# Altium schematic symbol library TI Power Management Shunt Voltage Reference.SchLib: 1526 symbols (part 5 of 18)
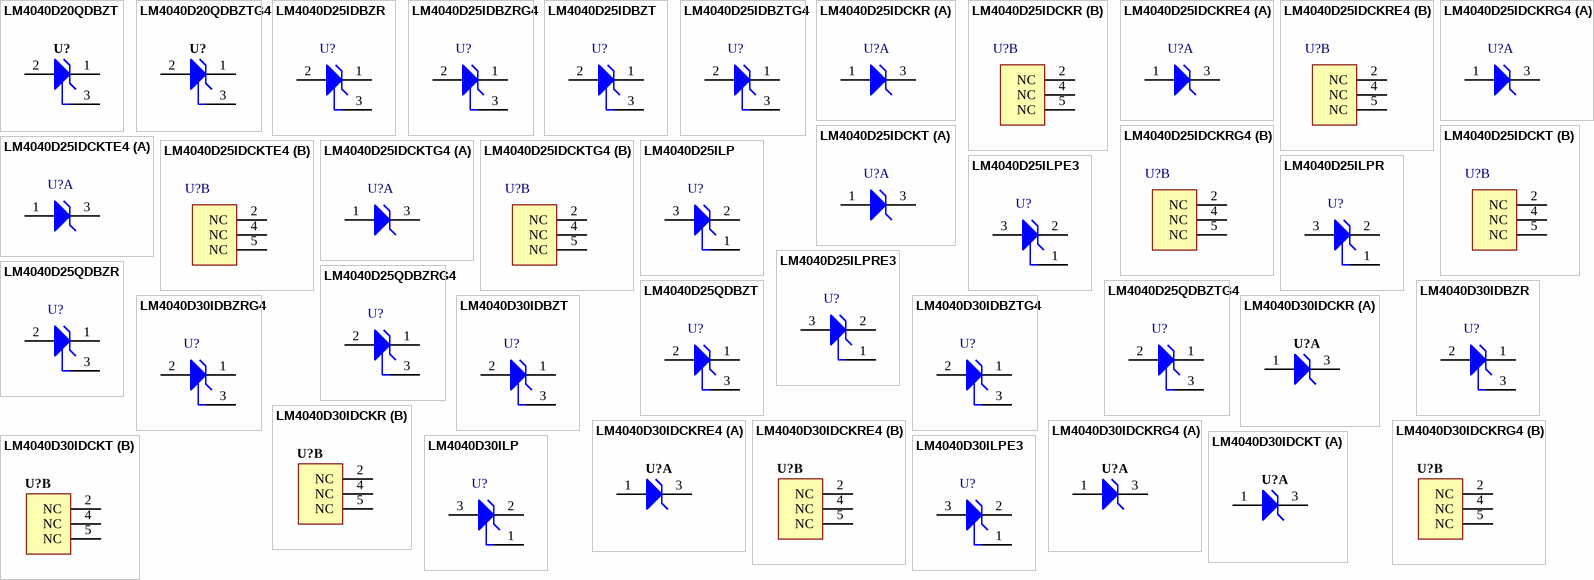
[diagram p61: symbols LM4040D20QDBZT to LM4040D30ILPE3]

## LM4040D25QDBZRG4
designator U?
Precision Micropower Shunt Voltage Reference, 1% accuracy, 2.5 V, 15 ppm / degC, 15 mA, -40 to 125 degC, 3-pin SOT-23 (DBZ), Green (RoHS & no Sb/Br); Manufacturer: Texas Instruments; PartNumber: LM4040D25QDBZRG4; Initial Accuracy @ 25/deg C(%): 1; Iout/Iz(Max)(mA): 15; Min Iz for Regulation(uA): 75; Rating: Catalog; Temp Coeff(Max)(ppm/ degree C): 150; VO(V): 2.5; DatasheetVersion: SLOS456K; PackageVersion: 4203227/B; PackageReference: DBZ3; PackageDescription: 3-Pin Plastic Small Outline, Body 2.92 x 1.3 mm, Pitch 0.95 mm; Supplier 1: Digi-Key; Supplier Part Number 1: LM4040D25QDBZRG4-ND; Supplier 2: Mouser; Supplier Part Number 2: 595-LM4040D25QDBZRG4; Eco-Plan: Green (RoHS & no Sb/Br); SubFamily: Shunt Voltage Reference; Temp Coeff(Typ)(ppm/ degree C): 15; Mounting Technology: Surface Mount; Code_JEDEC: TO-236; ComponentLink1Description: Manufacturer URL; ComponentLink1URL: http://www.ti.com/; ComponentLink2Description: Datasheet; ComponentLink2URL: http://www.ti.com/general/docs/lit/getliterature.tsp?genericPartNumber=LM4040D25&fileType=pdf; ComponentLink3Description: Package Specification; ComponentLink3URL: http://www.ti.com/litv/pdf/mpds108a
footprint TI-DBZ3_N (SOT23, 3-Leads, Body 2.92x1.3 mm, Pitch 0.95 mm, IPC Medium Density)
pins: 1 CATHODE, 2 ANODE, 3 NC

## LM4040D25QDBZT
designator U?
Precision Micropower Shunt Voltage Reference, 1% accuracy, 2.5 V, 15 ppm / degC, 15 mA, -40 to 125 degC, 3-pin SOT-23 (DBZ), Green (RoHS & no Sb/Br); Manufacturer: Texas Instruments; PartNumber: LM4040D25QDBZT; Initial Accuracy @ 25/deg C(%): 1; Iout/Iz(Max)(mA): 15; Min Iz for Regulation(uA): 75; Rating: Catalog; Temp Coeff(Max)(ppm/ degree C): 150; VO(V): 2.5; DatasheetVersion: SLOS456K; PackageVersion: 4203227/B; PackageReference: DBZ3; PackageDescription: 3-Pin Plastic Small Outline, Body 2.92 x 1.3 mm, Pitch 0.95 mm; Supplier 1: Digi-Key; Supplier Part Number 1: 296-32120-2-ND; Supplier 2: Digi-Key; Supplier Part Number 2: 296-32120-1-ND; Supplier 3: Digi-Key; Supplier Part Number 3: 296-32120-6-ND; Supplier 4: Newark; Supplier Part Number 4: 31K7134; Supplier 5: Mouser; Supplier Part Number 5: 595-LM4040D25QDBZT; Eco-Plan: Green (RoHS & no Sb/Br); SubFamily: Shunt Voltage Reference; Temp Coeff(Typ)(ppm/ degree C): 15; Mounting Technology: Surface Mount; Code_JEDEC: TO-236; ComponentLink1Description: Manufacturer URL; ComponentLink1URL: http://www.ti.com/; ComponentLink2Description: Datasheet; ComponentLink2URL: http://www.ti.com/general/docs/lit/getliterature.tsp?genericPartNumber=LM4040D25&fileType=pdf; ComponentLink3Description: Package Specification; ComponentLink3URL: http://www.ti.com/litv/pdf/mpds108a
footprint TI-DBZ3_N (SOT23, 3-Leads, Body 2.92x1.3 mm, Pitch 0.95 mm, IPC Medium Density)
pins: 1 CATHODE, 2 ANODE, 3 NC

## LM4040D25QDBZTG4
designator U?
Precision Micropower Shunt Voltage Reference, 1% accuracy, 2.5 V, 15 ppm / degC, 15 mA, -40 to 125 degC, 3-pin SOT-23 (DBZ), Green (RoHS & no Sb/Br); Manufacturer: Texas Instruments; PartNumber: LM4040D25QDBZTG4; Initial Accuracy @ 25/deg C(%): 1; Iout/Iz(Max)(mA): 15; Min Iz for Regulation(uA): 75; Rating: Catalog; Temp Coeff(Max)(ppm/ degree C): 150; VO(V): 2.5; DatasheetVersion: SLOS456K; PackageVersion: 4203227/B; PackageReference: DBZ3; PackageDescription: 3-Pin Plastic Small Outline, Body 2.92 x 1.3 mm, Pitch 0.95 mm; Supplier 1: Digi-Key; Supplier Part Number 1: LM4040D25QDBZTG4-ND; Supplier 2: Farnell; Supplier Part Number 2: 1053806; Supplier 3: Newark; Supplier Part Number 3: 97K3498; Supplier 4: Mouser; Supplier Part Number 4: 595-LM4040D25QDBZTG4; Eco-Plan: Green (RoHS & no Sb/Br); SubFamily: Shunt Voltage Reference; Temp Coeff(Typ)(ppm/ degree C): 15; Mounting Technology: Surface Mount; Code_JEDEC: TO-236; ComponentLink1Description: Manufacturer URL; ComponentLink1URL: http://www.ti.com/; ComponentLink2Description: Datasheet; ComponentLink2URL: http://www.ti.com/general/docs/lit/getliterature.tsp?genericPartNumber=LM4040D25&fileType=pdf; ComponentLink3Description: Package Specification; ComponentLink3URL: http://www.ti.com/litv/pdf/mpds108a; ComponentLink4Description: URL Link1; ComponentLink4URL: Samples URL:http://www.ti.com/product/lm4040d25
footprint TI-DBZ3_N (SOT23, 3-Leads, Body 2.92x1.3 mm, Pitch 0.95 mm, IPC Medium Density)
pins: 1 CATHODE, 2 ANODE, 3 NC

## LM4040D30IDBZR
designator U?
Precision Micropower Shunt Voltage Reference, 1% accuracy, 3 V, 15 ppm / degC, 15 mA, -40 to 85 degC, 3-pin SOT-23 (DBZ), Green (RoHS & no Sb/Br); Manufacturer: Texas Instruments; PartNumber: LM4040D30IDBZR; Initial Accuracy @ 25/deg C(%): 1; Iout/Iz(Max)(mA): 15; Min Iz for Regulation(uA): 65; Rating: Catalog; Temp Coeff(Max)(ppm/ degree C): 150; VO(V): 3; DatasheetVersion: SLOS456K; PackageVersion: 4203227/B; PackageReference: DBZ3; PackageDescription: 3-Pin Plastic Small Outline, Body 2.92 x 1.3 mm, Pitch 0.95 mm; Supplier 1: Digi-Key; Supplier Part Number 1: 296-19437-2-ND; Supplier 2: Digi-Key; Supplier Part Number 2: 296-19437-1-ND; Supplier 3: Digi-Key; Supplier Part Number 3: 296-19437-6-ND; Supplier 4: Newark; Supplier Part Number 4: 66K2459; Supplier 5: Mouser; Supplier Part Number 5: 595-LM4040D30IDBZR; Eco-Plan: Green (RoHS & no Sb/Br); SubFamily: Shunt Voltage Reference; Temp Coeff(Typ)(ppm/ degree C): 15; Mounting Technology: Surface Mount; Code_JEDEC: TO-236; ComponentLink1Description: Manufacturer URL; ComponentLink1URL: http://www.ti.com/; ComponentLink2Description: Datasheet; ComponentLink2URL: http://www.ti.com/general/docs/lit/getliterature.tsp?genericPartNumber=LM4040D30&fileType=pdf; ComponentLink3Description: Package Specification; ComponentLink3URL: http://www.ti.com/litv/pdf/mpds108a
footprint TI-DBZ3_N (SOT23, 3-Leads, Body 2.92x1.3 mm, Pitch 0.95 mm, IPC Medium Density)
pins: 1 CATHODE, 2 ANODE, 3 NC

## LM4040D30IDBZRG4
designator U?
Precision Micropower Shunt Voltage Reference, 1% accuracy, 3 V, 15 ppm / degC, 15 mA, -40 to 85 degC, 3-pin SOT-23 (DBZ), Green (RoHS & no Sb/Br); Manufacturer: Texas Instruments; PartNumber: LM4040D30IDBZRG4; Initial Accuracy @ 25/deg C(%): 1; Iout/Iz(Max)(mA): 15; Min Iz for Regulation(uA): 65; Rating: Catalog; Temp Coeff(Max)(ppm/ degree C): 150; VO(V): 3; DatasheetVersion: SLOS456K; PackageVersion: 4203227/B; PackageReference: DBZ3; PackageDescription: 3-Pin Plastic Small Outline, Body 2.92 x 1.3 mm, Pitch 0.95 mm; Supplier 1: Digi-Key; Supplier Part Number 1: LM4040D30IDBZRG4-ND; Supplier 2: Newark; Supplier Part Number 2: 85K1033; Supplier 3: Mouser; Supplier Part Number 3: 595-LM4040D30IDBZRG4; Eco-Plan: Green (RoHS & no Sb/Br); SubFamily: Shunt Voltage Reference; Temp Coeff(Typ)(ppm/ degree C): 15; Mounting Technology: Surface Mount; Code_JEDEC: TO-236; ComponentLink1Description: Manufacturer URL; ComponentLink1URL: http://www.ti.com/; ComponentLink2Description: Datasheet; ComponentLink2URL: http://www.ti.com/general/docs/lit/getliterature.tsp?genericPartNumber=LM4040D30&fileType=pdf; ComponentLink3Description: Package Specification; ComponentLink3URL: http://www.ti.com/litv/pdf/mpds108a
footprint TI-DBZ3_N (SOT23, 3-Leads, Body 2.92x1.3 mm, Pitch 0.95 mm, IPC Medium Density)
pins: 1 CATHODE, 2 ANODE, 3 NC

## LM4040D30IDBZT
designator U?
Precision Micropower Shunt Voltage Reference, 1% accuracy, 3 V, 15 ppm / degC, 15 mA, -40 to 85 degC, 3-pin SOT-23 (DBZ), Green (RoHS & no Sb/Br); Manufacturer: Texas Instruments; PartNumber: LM4040D30IDBZT; Initial Accuracy @ 25/deg C(%): 1; Iout/Iz(Max)(mA): 15; Min Iz for Regulation(uA): 65; Rating: Catalog; Temp Coeff(Max)(ppm/ degree C): 150; VO(V): 3; DatasheetVersion: SLOS456K; PackageVersion: 4203227/B; PackageReference: DBZ3; PackageDescription: 3-Pin Plastic Small Outline, Body 2.92 x 1.3 mm, Pitch 0.95 mm; Supplier 1: Digi-Key; Supplier Part Number 1: 296-32121-2-ND; Supplier 2: Digi-Key; Supplier Part Number 2: 296-32121-1-ND; Supplier 3: Digi-Key; Supplier Part Number 3: 296-32121-6-ND; Supplier 4: Newark; Supplier Part Number 4: 66K2460; Supplier 5: Mouser; Supplier Part Number 5: 595-LM4040D30IDBZT; Eco-Plan: Green (RoHS & no Sb/Br); SubFamily: Shunt Voltage Reference; Temp Coeff(Typ)(ppm/ degree C): 15; Mounting Technology: Surface Mount; Code_JEDEC: TO-236; ComponentLink1Description: Manufacturer URL; ComponentLink1URL: http://www.ti.com/; ComponentLink2Description: Datasheet; ComponentLink2URL: http://www.ti.com/general/docs/lit/getliterature.tsp?genericPartNumber=LM4040D30&fileType=pdf; ComponentLink3Description: Package Specification; ComponentLink3URL: http://www.ti.com/litv/pdf/mpds108a
footprint TI-DBZ3_N (SOT23, 3-Leads, Body 2.92x1.3 mm, Pitch 0.95 mm, IPC Medium Density)
pins: 1 CATHODE, 2 ANODE, 3 NC

## LM4040D30IDBZTG4
designator U?
Precision Micropower Shunt Voltage Reference, 1% accuracy, 3 V, 15 ppm / degC, 15 mA, -40 to 85 degC, 3-pin SOT-23 (DBZ), Green (RoHS & no Sb/Br); Manufacturer: Texas Instruments; PartNumber: LM4040D30IDBZTG4; Initial Accuracy @ 25/deg C(%): 1; Iout/Iz(Max)(mA): 15; Min Iz for Regulation(uA): 65; Rating: Catalog; Temp Coeff(Max)(ppm/ degree C): 150; VO(V): 3; DatasheetVersion: SLOS456K; PackageVersion: 4203227/B; PackageReference: DBZ3; PackageDescription: 3-Pin Plastic Small Outline, Body 2.92 x 1.3 mm, Pitch 0.95 mm; Supplier 1: Digi-Key; Supplier Part Number 1: LM4040D30IDBZTG4-ND; Supplier 2: Farnell; Supplier Part Number 2: 1494903; Supplier 3: Newark; Supplier Part Number 3: 61M7487; Supplier 4: Mouser; Supplier Part Number 4: 595-LM4040D30IDBZTG4; Eco-Plan: Green (RoHS & no Sb/Br); SubFamily: Shunt Voltage Reference; Temp Coeff(Typ)(ppm/ degree C): 15; Mounting Technology: Surface Mount; Code_JEDEC: TO-236; ComponentLink1Description: Manufacturer URL; ComponentLink1URL: http://www.ti.com/; ComponentLink2Description: Datasheet; ComponentLink2URL: http://www.ti.com/general/docs/lit/getliterature.tsp?genericPartNumber=LM4040D30&fileType=pdf; ComponentLink3Description: Package Specification; ComponentLink3URL: http://www.ti.com/litv/pdf/mpds108a
footprint TI-DBZ3_N (SOT23, 3-Leads, Body 2.92x1.3 mm, Pitch 0.95 mm, IPC Medium Density)
pins: 1 CATHODE, 2 ANODE, 3 NC

## LM4040D30IDCKR
designator U?
Precision Micropower Shunt Voltage Reference, 1% accuracy, 3 V, 15 ppm / degC, 15 mA, -40 to 85 degC, 5-pin SC70 (DCK), Green (RoHS & no Sb/Br); Manufacturer: Texas Instruments; PartNumber: LM4040D30IDCKR; Initial Accuracy @ 25/deg C(%): 1; Iout/Iz(Max)(mA): 15; Min Iz for Regulation(uA): 65; Rating: Catalog; Temp Coeff(Max)(ppm/ degree C): 150; VO(V): 3; DatasheetVersion: SLOS456K; PackageReference: DCK5; PackageDescription: 5-Pin Plastic Small-Outline Package, 2 x 1.3 mm Body, 0.65 mm Pitch, 2.1 mm Lead Span; Supplier 1: Digi-Key; Supplier Part Number 1: 296-20902-2-ND; Supplier 2: Digi-Key; Supplier Part Number 2: 296-20902-1-ND; Supplier 3: Digi-Key; Supplier Part Number 3: 296-20902-6-ND; Supplier 4: Farnell; Supplier Part Number 4: 2144324; Supplier 5: Newark; Supplier Part Number 5: 66K2461; Supplier 6: Newark; Supplier Part Number 6: 46W1549; Supplier 7: Mouser; Supplier Part Number 7: 595-LM4040D30IDCKR; Eco-Plan: Green (RoHS & no Sb/Br); SubFamily: Shunt Voltage Reference; Temp Coeff(Typ)(ppm/ degree C): 15; Mounting Technology: Surface Mount; Code_JEDEC: MO-203; ComponentLink1Description: Manufacturer URL; ComponentLink1URL: http://www.ti.com/; ComponentLink2Description: Datasheet; ComponentLink2URL: http://www.ti.com/general/docs/lit/getliterature.tsp?genericPartNumber=LM4040D30&fileType=pdf; ComponentLink3Description: Package Specification; ComponentLink3URL: http://www.ti.com/litv/pdf/mpds025f
footprint TI-DCK5_N (SOT353, 5-Leads, Body 2x1.3mm, Pitch 0.65mm, Lead Span 2.1mm, IPC Medium Density)
part A pins: 1 ANODE, 3 CATHODE
part B pins: 2 NC, 4 NC, 5 NC

## LM4040D30IDCKRE4
designator U?
Precision Micropower Shunt Voltage Reference, 1% accuracy, 3 V, 15 ppm / degC, 15 mA, -40 to 85 degC, 5-pin SC70 (DCK), Green (RoHS & no Sb/Br); Manufacturer: Texas Instruments; PartNumber: LM4040D30IDCKRE4; Initial Accuracy @ 25/deg C(%): 1; Iout/Iz(Max)(mA): 15; Min Iz for Regulation(uA): 65; Rating: Catalog; Temp Coeff(Max)(ppm/ degree C): 150; VO(V): 3; DatasheetVersion: SLOS456K; PackageReference: DCK5; PackageDescription: 5-Pin Plastic Small-Outline Package, 2 x 1.3 mm Body, 0.65 mm Pitch, 2.1 mm Lead Span; Supplier 1: Digi-Key; Supplier Part Number 1: LM4040D30IDCKRE4-ND; Supplier 2: Mouser; Supplier Part Number 2: 595-LM4040D30IDCKRE4; Eco-Plan: Green (RoHS & no Sb/Br); SubFamily: Shunt Voltage Reference; Temp Coeff(Typ)(ppm/ degree C): 15; Mounting Technology: Surface Mount; Code_JEDEC: MO-203; ComponentLink1Description: Manufacturer URL; ComponentLink1URL: http://www.ti.com/; ComponentLink2Description: Datasheet; ComponentLink2URL: http://www.ti.com/general/docs/lit/getliterature.tsp?genericPartNumber=LM4040D30&fileType=pdf; ComponentLink3Description: Package Specification; ComponentLink3URL: http://www.ti.com/litv/pdf/mpds025f
footprint TI-DCK5_N (SOT353, 5-Leads, Body 2x1.3mm, Pitch 0.65mm, Lead Span 2.1mm, IPC Medium Density)
part A pins: 1 ANODE, 3 CATHODE
part B pins: 2 NC, 4 NC, 5 NC

## LM4040D30IDCKRG4
designator U?
Precision Micropower Shunt Voltage Reference, 1% accuracy, 3 V, 15 ppm / degC, 15 mA, -40 to 85 degC, 5-pin SC70 (DCK), Green (RoHS & no Sb/Br); Manufacturer: Texas Instruments; PartNumber: LM4040D30IDCKRG4; Initial Accuracy @ 25/deg C(%): 1; Iout/Iz(Max)(mA): 15; Min Iz for Regulation(uA): 65; Rating: Catalog; Temp Coeff(Max)(ppm/ degree C): 150; VO(V): 3; DatasheetVersion: SLOS456K; PackageReference: DCK5; PackageDescription: 5-Pin Plastic Small-Outline Package, 2 x 1.3 mm Body, 0.65 mm Pitch, 2.1 mm Lead Span; Supplier 1: Digi-Key; Supplier Part Number 1: LM4040D30IDCKRG4-ND; Supplier 2: Newark; Supplier Part Number 2: 41M3451; Supplier 3: Mouser; Supplier Part Number 3: 595-LM4040D30IDCKRG4; Eco-Plan: Green (RoHS & no Sb/Br); SubFamily: Shunt Voltage Reference; Temp Coeff(Typ)(ppm/ degree C): 15; Mounting Technology: Surface Mount; Code_JEDEC: MO-203; ComponentLink1Description: Manufacturer URL; ComponentLink1URL: http://www.ti.com/; ComponentLink2Description: Datasheet; ComponentLink2URL: http://www.ti.com/general/docs/lit/getliterature.tsp?genericPartNumber=LM4040D30&fileType=pdf; ComponentLink3Description: Package Specification; ComponentLink3URL: http://www.ti.com/litv/pdf/mpds025f
footprint TI-DCK5_N (SOT353, 5-Leads, Body 2x1.3mm, Pitch 0.65mm, Lead Span 2.1mm, IPC Medium Density)
part A pins: 1 ANODE, 3 CATHODE
part B pins: 2 NC, 4 NC, 5 NC

## LM4040D30IDCKT
designator U?
Precision Micropower Shunt Voltage Reference, 1% accuracy, 3 V, 15 ppm / degC, 15 mA, -40 to 85 degC, 5-pin SC70 (DCK); Manufacturer: Texas Instruments; PartNumber: LM4040D30IDCKT; Initial Accuracy @ 25/deg C(%): 1; Iout/Iz(Max)(mA): 15; Min Iz for Regulation(uA): 65; Rating: Catalog; Temp Coeff(Max)(ppm/ degree C): 150; VO(V): 3; DatasheetVersion: SLOS456K; PackageReference: DCK5; PackageDescription: 5-Pin Plastic Small-Outline Package, 2 x 1.3 mm Body, 0.65 mm Pitch, 2.1 mm Lead Span; Supplier 1: Mouser; Supplier Part Number 1: N/A; SubFamily: Shunt Voltage Reference; Temp Coeff(Typ)(ppm/ degree C): 15; Mounting Technology: Surface Mount; Code_JEDEC: MO-203; ComponentLink1Description: Manufacturer URL; ComponentLink1URL: http://www.ti.com/; ComponentLink2Description: Datasheet; ComponentLink2URL: http://www.ti.com/general/docs/lit/getliterature.tsp?genericPartNumber=LM4040D30&fileType=pdf; ComponentLink3Description: Package Specification; ComponentLink3URL: http://www.ti.com/litv/pdf/mpds025f
footprint TI-DCK5_N (SOT353, 5-Leads, Body 2x1.3mm, Pitch 0.65mm, Lead Span 2.1mm, IPC Medium Density)
part A pins: 1 ANODE, 3 CATHODE
part B pins: 2 NC, 4 NC, 5 NC

## LM4040D30ILP
designator U?
Precision Micropower Shunt Voltage Reference, 1% accuracy, 3 V, 15 ppm / degC, 15 mA, -40 to 85 degC, 3-pin TO-92 (LP), Pb-Free (RoHS); Manufacturer: Texas Instruments; PartNumber: LM4040D30ILP; Initial Accuracy @ 25/deg C(%): 1; Iout/Iz(Max)(mA): 15; Min Iz for Regulation(uA): 65; Rating: Catalog; Temp Coeff(Max)(ppm/ degree C): 150; VO(V): 3; DatasheetVersion: SLOS456K; PackageVersion: 4040001-2/C; PackageReference: LP3; PackageDescription: Plastic Cylindrical Package, Formed Lead Option (TO-92); Supplier 1: Digi-Key; Supplier Part Number 1: 296-31370-ND; Supplier 2: Newark; Supplier Part Number 2: 33M9287; Supplier 3: Mouser; Supplier Part Number 3: 595-LM4040D30ILP; Eco-Plan: Pb-Free (RoHS); SubFamily: Shunt Voltage Reference; Temp Coeff(Typ)(ppm/ degree C): 15; Mounting Technology: Through Hole; Code_JEDEC: TO-226; ComponentLink1Description: Manufacturer URL; ComponentLink1URL: http://www.ti.com/; ComponentLink2Description: Datasheet; ComponentLink2URL: http://www.ti.com/general/docs/lit/getliterature.tsp?genericPartNumber=LM4040D30&fileType=pdf; ComponentLink3Description: Package Specification; ComponentLink3URL: http://www.ti.com/litv/pdf/msot002a
footprint TI-LP3 (TO, Flat Index; 3 In-Line, Formed Axial Leads; Body Dia. 4.8mm; Leads 0.56 x 0.41 mm (max))
pins: 1 NC "No internal connection", 2 CATHODE, 3 ANODE

## LM4040D30ILPE3
designator U?
Precision Micropower Shunt Voltage Reference, 1% accuracy, 3 V, 15 ppm / degC, 15 mA, -40 to 85 degC, 3-pin TO-92 (LP), Pb-Free (RoHS); Manufacturer: Texas Instruments; PartNumber: LM4040D30ILPE3; Initial Accuracy @ 25/deg C(%): 1; Iout/Iz(Max)(mA): 15; Min Iz for Regulation(uA): 65; Rating: Catalog; Temp Coeff(Max)(ppm/ degree C): 150; VO(V): 3; DatasheetVersion: SLOS456K; PackageVersion: 4040001-2/C; PackageReference: LP3; PackageDescription: Plastic Cylindrical Package, Formed Lead Option (TO-92); Supplier 1: Digi-Key; Supplier Part Number 1: LM4040D30ILPE3-ND; Supplier 2: Newark; Supplier Part Number 2: 65M1438; Supplier 3: Mouser; Supplier Part Number 3: 595-LM4040D30ILPE3; Eco-Plan: Pb-Free (RoHS); SubFamily: Shunt Voltage Reference; Temp Coeff(Typ)(ppm/ degree C): 15; Mounting Technology: Through Hole; Code_JEDEC: TO-226; ComponentLink1Description: Manufacturer URL; ComponentLink1URL: http://www.ti.com/; ComponentLink2Description: Datasheet; ComponentLink2URL: http://www.ti.com/general/docs/lit/getliterature.tsp?genericPartNumber=LM4040D30&fileType=pdf; ComponentLink3Description: Package Specification; ComponentLink3URL: http://www.ti.com/litv/pdf/msot002a
footprint TI-LP3 (TO, Flat Index; 3 In-Line, Formed Axial Leads; Body Dia. 4.8mm; Leads 0.56 x 0.41 mm (max))
pins: 1 NC "No internal connection", 2 CATHODE, 3 ANODE

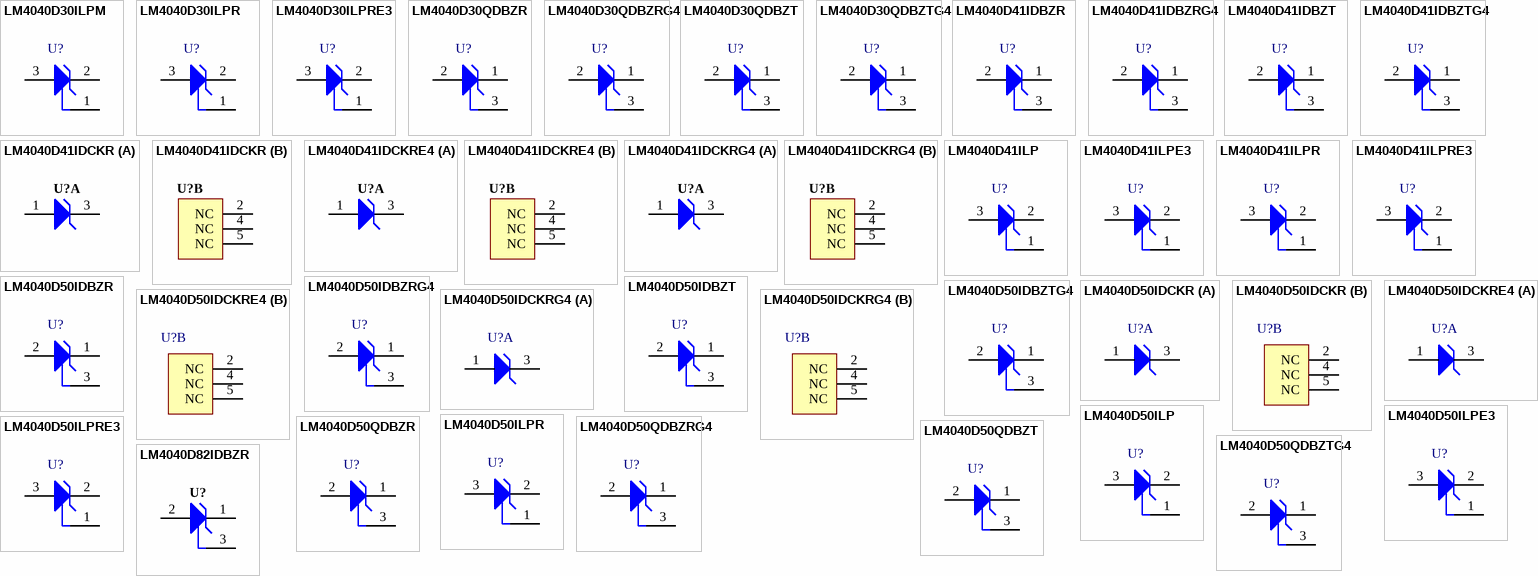
[diagram p13: symbols LM4040D30ILPM to LM4040D82IDBZR]

## LM4040D30ILPM
designator U?
Precision Micropower Shunt Voltage Reference, 1% accuracy, 3 V, 15 ppm / degC, 15 mA, -40 to 85 degC, 3-pin TO-92 (LP); Manufacturer: Texas Instruments; PartNumber: LM4040D30ILPM; Initial Accuracy @ 25/deg C(%): 1; Iout/Iz(Max)(mA): 15; Min Iz for Regulation(uA): 65; Rating: Catalog; Temp Coeff(Max)(ppm/ degree C): 150; VO(V): 3; DatasheetVersion: SLOS456K; PackageVersion: 4040001-2/C; PackageReference: LP3; PackageDescription: Plastic Cylindrical Package, Formed Lead Option (TO-92); Supplier 1: Mouser; Supplier Part Number 1: N/A; SubFamily: Shunt Voltage Reference; Temp Coeff(Typ)(ppm/ degree C): 15; Mounting Technology: Through Hole; Code_JEDEC: TO-226; ComponentLink1Description: Manufacturer URL; ComponentLink1URL: http://www.ti.com/; ComponentLink2Description: Datasheet; ComponentLink2URL: http://www.ti.com/general/docs/lit/getliterature.tsp?genericPartNumber=LM4040D30&fileType=pdf; ComponentLink3Description: Package Specification; ComponentLink3URL: http://www.ti.com/litv/pdf/msot002a
footprint TI-LP3 (TO, Flat Index; 3 In-Line, Formed Axial Leads; Body Dia. 4.8mm; Leads 0.56 x 0.41 mm (max))
pins: 1 NC "No internal connection", 2 CATHODE, 3 ANODE

## LM4040D30ILPR
designator U?
Precision Micropower Shunt Voltage Reference, 1% accuracy, 3 V, 15 ppm / degC, 15 mA, -40 to 85 degC, 3-pin TO-92 (LP), Pb-Free (RoHS); Manufacturer: Texas Instruments; PartNumber: LM4040D30ILPR; Initial Accuracy @ 25/deg C(%): 1; Iout/Iz(Max)(mA): 15; Min Iz for Regulation(uA): 65; Rating: Catalog; Temp Coeff(Max)(ppm/ degree C): 150; VO(V): 3; DatasheetVersion: SLOS456K; PackageVersion: 4040001-2/C; PackageReference: LP3; PackageDescription: Plastic Cylindrical Package, Formed Lead Option (TO-92); Supplier 1: Digi-Key; Supplier Part Number 1: 296-21583-3-ND; Supplier 2: Digi-Key; Supplier Part Number 2: 296-21583-1-ND; Supplier 3: Newark; Supplier Part Number 3: 33M9288; Supplier 4: Mouser; Supplier Part Number 4: 595-LM4040D30ILPR; Eco-Plan: Pb-Free (RoHS); SubFamily: Shunt Voltage Reference; Temp Coeff(Typ)(ppm/ degree C): 15; Mounting Technology: Through Hole; Code_JEDEC: TO-226; ComponentLink1Description: Manufacturer URL; ComponentLink1URL: http://www.ti.com/; ComponentLink2Description: Datasheet; ComponentLink2URL: http://www.ti.com/general/docs/lit/getliterature.tsp?genericPartNumber=LM4040D30&fileType=pdf; ComponentLink3Description: Package Specification; ComponentLink3URL: http://www.ti.com/litv/pdf/msot002a
footprint TI-LP3 (TO, Flat Index; 3 In-Line, Formed Axial Leads; Body Dia. 4.8mm; Leads 0.56 x 0.41 mm (max))
pins: 1 NC "No internal connection", 2 CATHODE, 3 ANODE

## LM4040D30ILPRE3
designator U?
Precision Micropower Shunt Voltage Reference, 1% accuracy, 3 V, 15 ppm / degC, 15 mA, -40 to 85 degC, 3-pin TO-92 (LP), Pb-Free (RoHS); Manufacturer: Texas Instruments; PartNumber: LM4040D30ILPRE3; Initial Accuracy @ 25/deg C(%): 1; Iout/Iz(Max)(mA): 15; Min Iz for Regulation(uA): 65; Rating: Catalog; Temp Coeff(Max)(ppm/ degree C): 150; VO(V): 3; DatasheetVersion: SLOS456K; PackageVersion: 4040001-2/C; PackageReference: LP3; PackageDescription: Plastic Cylindrical Package, Formed Lead Option (TO-92); Supplier 1: Digi-Key; Supplier Part Number 1: LM4040D30ILPRE3-ND; Supplier 2: Mouser; Supplier Part Number 2: 595-LM4040D30ILPRE3; Eco-Plan: Pb-Free (RoHS); SubFamily: Shunt Voltage Reference; Temp Coeff(Typ)(ppm/ degree C): 15; Mounting Technology: Through Hole; Code_JEDEC: TO-226; ComponentLink1Description: Manufacturer URL; ComponentLink1URL: http://www.ti.com/; ComponentLink2Description: Datasheet; ComponentLink2URL: http://www.ti.com/general/docs/lit/getliterature.tsp?genericPartNumber=LM4040D30&fileType=pdf; ComponentLink3Description: Package Specification; ComponentLink3URL: http://www.ti.com/litv/pdf/msot002a
footprint TI-LP3 (TO, Flat Index; 3 In-Line, Formed Axial Leads; Body Dia. 4.8mm; Leads 0.56 x 0.41 mm (max))
pins: 1 NC "No internal connection", 2 CATHODE, 3 ANODE

## LM4040D30QDBZR
designator U?
Precision Micropower Shunt Voltage Reference, 1% accuracy, 3 V, 15 ppm / degC, 15 mA, -40 to 125 degC, 3-pin SOT-23 (DBZ), Green (RoHS & no Sb/Br); Manufacturer: Texas Instruments; PartNumber: LM4040D30QDBZR; Initial Accuracy @ 25/deg C(%): 1; Iout/Iz(Max)(mA): 15; Min Iz for Regulation(uA): 65; Rating: Catalog; Temp Coeff(Max)(ppm/ degree C): 150; VO(V): 3; DatasheetVersion: SLOS456K; PackageVersion: 4203227/B; PackageReference: DBZ3; PackageDescription: 3-Pin Plastic Small Outline, Body 2.92 x 1.3 mm, Pitch 0.95 mm; Supplier 1: Digi-Key; Supplier Part Number 1: 296-20903-2-ND; Supplier 2: Digi-Key; Supplier Part Number 2: 296-20903-1-ND; Supplier 3: Digi-Key; Supplier Part Number 3: 296-20903-6-ND; Supplier 4: Newark; Supplier Part Number 4: 66K2462; Supplier 5: Mouser; Supplier Part Number 5: 595-LM4040D30QDBZR; Eco-Plan: Green (RoHS & no Sb/Br); SubFamily: Shunt Voltage Reference; Temp Coeff(Typ)(ppm/ degree C): 15; Mounting Technology: Surface Mount; Code_JEDEC: TO-236; ComponentLink1Description: Manufacturer URL; ComponentLink1URL: http://www.ti.com/; ComponentLink2Description: Datasheet; ComponentLink2URL: http://www.ti.com/general/docs/lit/getliterature.tsp?genericPartNumber=LM4040D30&fileType=pdf; ComponentLink3Description: Package Specification; ComponentLink3URL: http://www.ti.com/litv/pdf/mpds108a; ComponentLink4Description: URL Link1; ComponentLink4URL: Samples URL:http://www.ti.com/product/lm4040d30
footprint TI-DBZ3_N (SOT23, 3-Leads, Body 2.92x1.3 mm, Pitch 0.95 mm, IPC Medium Density)
pins: 1 CATHODE, 2 ANODE, 3 NC

## LM4040D30QDBZRG4
designator U?
Precision Micropower Shunt Voltage Reference, 1% accuracy, 3 V, 15 ppm / degC, 15 mA, -40 to 125 degC, 3-pin SOT-23 (DBZ), Green (RoHS & no Sb/Br); Manufacturer: Texas Instruments; PartNumber: LM4040D30QDBZRG4; Initial Accuracy @ 25/deg C(%): 1; Iout/Iz(Max)(mA): 15; Min Iz for Regulation(uA): 65; Rating: Catalog; Temp Coeff(Max)(ppm/ degree C): 150; VO(V): 3; DatasheetVersion: SLOS456K; PackageVersion: 4203227/B; PackageReference: DBZ3; PackageDescription: 3-Pin Plastic Small Outline, Body 2.92 x 1.3 mm, Pitch 0.95 mm; Supplier 1: Digi-Key; Supplier Part Number 1: LM4040D30QDBZRG4-ND; Supplier 2: Mouser; Supplier Part Number 2: 595-LM4040D30QDBZRG4; Eco-Plan: Green (RoHS & no Sb/Br); SubFamily: Shunt Voltage Reference; Temp Coeff(Typ)(ppm/ degree C): 15; Mounting Technology: Surface Mount; Code_JEDEC: TO-236; ComponentLink1Description: Manufacturer URL; ComponentLink1URL: http://www.ti.com/; ComponentLink2Description: Datasheet; ComponentLink2URL: http://www.ti.com/general/docs/lit/getliterature.tsp?genericPartNumber=LM4040D30&fileType=pdf; ComponentLink3Description: Package Specification; ComponentLink3URL: http://www.ti.com/litv/pdf/mpds108a; ComponentLink4Description: URL Link1; ComponentLink4URL: Samples URL:http://www.ti.com/product/lm4040d30
footprint TI-DBZ3_N (SOT23, 3-Leads, Body 2.92x1.3 mm, Pitch 0.95 mm, IPC Medium Density)
pins: 1 CATHODE, 2 ANODE, 3 NC

## LM4040D30QDBZT
designator U?
Precision Micropower Shunt Voltage Reference, 1% accuracy, 3 V, 15 ppm / degC, 15 mA, -40 to 125 degC, 3-pin SOT-23 (DBZ), Green (RoHS & no Sb/Br); Manufacturer: Texas Instruments; PartNumber: LM4040D30QDBZT; Initial Accuracy @ 25/deg C(%): 1; Iout/Iz(Max)(mA): 15; Min Iz for Regulation(uA): 65; Rating: Catalog; Temp Coeff(Max)(ppm/ degree C): 150; VO(V): 3; DatasheetVersion: SLOS456K; PackageVersion: 4203227/B; PackageReference: DBZ3; PackageDescription: 3-Pin Plastic Small Outline, Body 2.92 x 1.3 mm, Pitch 0.95 mm; Supplier 1: Digi-Key; Supplier Part Number 1: LM4040D30QDBZT-ND; Supplier 2: Mouser; Supplier Part Number 2: 595-LM4040D30QDBZT; Eco-Plan: Green (RoHS & no Sb/Br); SubFamily: Shunt Voltage Reference; Temp Coeff(Typ)(ppm/ degree C): 15; Mounting Technology: Surface Mount; Code_JEDEC: TO-236; ComponentLink1Description: Manufacturer URL; ComponentLink1URL: http://www.ti.com/; ComponentLink2Description: Datasheet; ComponentLink2URL: http://www.ti.com/general/docs/lit/getliterature.tsp?genericPartNumber=LM4040D30&fileType=pdf; ComponentLink3Description: Package Specification; ComponentLink3URL: http://www.ti.com/litv/pdf/mpds108a
footprint TI-DBZ3_N (SOT23, 3-Leads, Body 2.92x1.3 mm, Pitch 0.95 mm, IPC Medium Density)
pins: 1 CATHODE, 2 ANODE, 3 NC

## LM4040D30QDBZTG4
designator U?
Precision Micropower Shunt Voltage Reference, 1% accuracy, 3 V, 15 ppm / degC, 15 mA, -40 to 125 degC, 3-pin SOT-23 (DBZ), Green (RoHS & no Sb/Br); Manufacturer: Texas Instruments; PartNumber: LM4040D30QDBZTG4; Initial Accuracy @ 25/deg C(%): 1; Iout/Iz(Max)(mA): 15; Min Iz for Regulation(uA): 65; Rating: Catalog; Temp Coeff(Max)(ppm/ degree C): 150; VO(V): 3; DatasheetVersion: SLOS456K; PackageVersion: 4203227/B; PackageReference: DBZ3; PackageDescription: 3-Pin Plastic Small Outline, Body 2.92 x 1.3 mm, Pitch 0.95 mm; Supplier 1: Digi-Key; Supplier Part Number 1: LM4040D30QDBZTG4-ND; Supplier 2: Mouser; Supplier Part Number 2: 595-LM4040D30QDBZTG4; Eco-Plan: Green (RoHS & no Sb/Br); SubFamily: Shunt Voltage Reference; Temp Coeff(Typ)(ppm/ degree C): 15; Mounting Technology: Surface Mount; Code_JEDEC: TO-236; ComponentLink1Description: Manufacturer URL; ComponentLink1URL: http://www.ti.com/; ComponentLink2Description: Datasheet; ComponentLink2URL: http://www.ti.com/general/docs/lit/getliterature.tsp?genericPartNumber=LM4040D30&fileType=pdf; ComponentLink3Description: Package Specification; ComponentLink3URL: http://www.ti.com/litv/pdf/mpds108a; ComponentLink4Description: URL Link1; ComponentLink4URL: Samples URL:http://www.ti.com/product/lm4040d30
footprint TI-DBZ3_N (SOT23, 3-Leads, Body 2.92x1.3 mm, Pitch 0.95 mm, IPC Medium Density)
pins: 1 CATHODE, 2 ANODE, 3 NC

## LM4040D41IDBZR
designator U?
Precision Micropower Shunt Voltage Reference, 1% accuracy, 4.096 V, 15 ppm / degC, 15 mA, -40 to 85 degC, 3-pin SOT-23 (DBZ), Green (RoHS & no Sb/Br); Manufacturer: Texas Instruments; PartNumber: LM4040D41IDBZR; Initial Accuracy @ 25/deg C(%): 1; Iout/Iz(Max)(mA): 15; Min Iz for Regulation(uA): 73; Rating: Catalog; Temp Coeff(Max)(ppm/ degree C): 150; VO(V): 4.096; DatasheetVersion: SLOS456K; PackageVersion: 4203227/B; PackageReference: DBZ3; PackageDescription: 3-Pin Plastic Small Outline, Body 2.92 x 1.3 mm, Pitch 0.95 mm; Supplier 1: Digi-Key; Supplier Part Number 1: 296-20904-2-ND; Supplier 2: Digi-Key; Supplier Part Number 2: 296-20904-1-ND; Supplier 3: Digi-Key; Supplier Part Number 3: 296-20904-6-ND; Supplier 4: Farnell; Supplier Part Number 4: 1575269; Supplier 5: Newark; Supplier Part Number 5: 66K2464; Supplier 6: Mouser; Supplier Part Number 6: 595-LM4040D41IDBZR; Eco-Plan: Green (RoHS & no Sb/Br); SubFamily: Shunt Voltage Reference; Temp Coeff(Typ)(ppm/ degree C): 15; Mounting Technology: Surface Mount; Code_JEDEC: TO-236; ComponentLink1Description: Manufacturer URL; ComponentLink1URL: http://www.ti.com/; ComponentLink2Description: Datasheet; ComponentLink2URL: http://www.ti.com/general/docs/lit/getliterature.tsp?genericPartNumber=LM4040D41&fileType=pdf; ComponentLink3Description: Package Specification; ComponentLink3URL: http://www.ti.com/litv/pdf/mpds108a; ComponentLink4Description: URL Link1; ComponentLink4URL: Samples URL:http://www.ti.com/product/lm4040d41
footprint TI-DBZ3_N (SOT23, 3-Leads, Body 2.92x1.3 mm, Pitch 0.95 mm, IPC Medium Density)
pins: 1 CATHODE, 2 ANODE, 3 NC
